# Altium schematic symbol library Capacitor - Ceramic - Sumsung.SchLib: 1421 symbols (part 4 of 8)
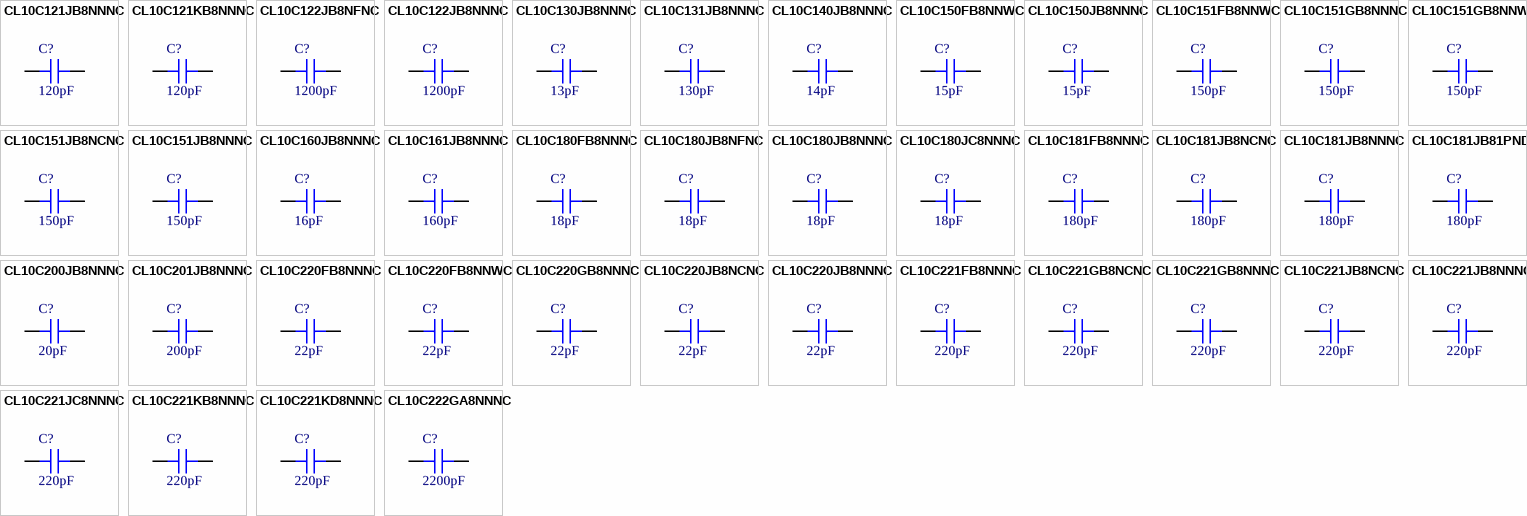
[diagram p38: symbols CL10C121JB8NNNC to CL10C222GA8NNNC]

## CL10C180JB8NNNC
designator C?, comment 18pF
CAP CER 18PF 50V NP0 0603; Part Number: CL10C180JB8NNNC; Manufacturer: Samsung Electro-Mechanics America, Inc.; TemperatureRange: -55C ~ 125C; TemperatureCoefficient: C0G, NP0; Tolerance: 5%; Value: 18pF; PartId: 5316; Supplier 1: Digi-Key; Supplier Part Number 1: 1276-1089-2-ND; ComponentLink1Description: Datasheet; ComponentLink1URL: http://www.samsungsem.com/kr/support/product-search/mlcc/CL10C180JB8NNNC.jsp; ComponentLink2Description: Digi-Key listing; ComponentLink2URL: http://digikey.com/product-detail/en/CL10C180JB8NNNC/1276-1089-2-ND/3886747; Voltage: 50V; Price: 0.0083; Type: -; Device Package: 0603 (1608 Metric)
footprint CAP 0603/1608
pins: 1, 2

## CL10C180JC8NNNC
designator C?, comment 18pF
CAP CER 18PF 100V NP0 0603; Part Number: CL10C180JC8NNNC; Manufacturer: Samsung Electro-Mechanics America, Inc.; TemperatureRange: -55C ~ 125C; TemperatureCoefficient: C0G, NP0; Tolerance: 5%; Value: 18pF; PartId: 5432; Supplier 1: Digi-Key; Supplier Part Number 1: 1276-2210-2-ND; ComponentLink1Description: Datasheet; ComponentLink1URL: http://www.samsungsem.com/kr/support/product-search/mlcc/CL10C180JC8NNNC.jsp; ComponentLink2Description: Digi-Key listing; ComponentLink2URL: http://digikey.com/product-detail/en/CL10C180JC8NNNC/1276-2210-2-ND/3887868; Voltage: 100V; Price: 0.0142; Type: -; Device Package: 0603 (1608 Metric)
footprint CAP 0603/1608
pins: 1, 2

## CL10C181FB8NNNC
designator C?, comment 180pF
CAP CER 180PF 50V NP0 0603; Part Number: CL10C181FB8NNNC; Manufacturer: Samsung Electro-Mechanics America, Inc.; TemperatureRange: -55C ~ 125C; TemperatureCoefficient: C0G, NP0; Tolerance: 1%; Value: 180pF; PartId: 5654; Supplier 1: Digi-Key; Supplier Part Number 1: 1276-2211-2-ND; ComponentLink1Description: Datasheet; ComponentLink1URL: http://media.digikey.com/pdf/Data%20Sheets/Samsung%20PDFs/CL10C181FB8NNNC_Spec.pdf; ComponentLink2Description: Digi-Key listing; ComponentLink2URL: http://digikey.com/product-detail/en/CL10C181FB8NNNC/1276-2211-2-ND/3887869; Voltage: 50V; Price: 0.0639; Type: -; Device Package: 0603 (1608 Metric)
footprint CAP 0603/1608
pins: 1, 2

## CL10C181JB8NCNC
designator C?, comment 180pF
CAP CER 180PF 50V NP0 0603; Part Number: CL10C181JB8NCNC; Manufacturer: Samsung Electro-Mechanics America, Inc.; TemperatureRange: -55C ~ 125C; TemperatureCoefficient: C0G, NP0; Tolerance: 5%; Value: 180pF; PartId: 13530; Supplier 1: Digi-Key; Supplier Part Number 1: 1276-2213-2-ND; ComponentLink1Description: Datasheet; ComponentLink1URL: //media.digikey.com/pdf/Data%20Sheets/Samsung%20PDFs/CL10C181JB8NCNC_Spec.pdf; ComponentLink2Description: Digi-Key Listing; ComponentLink2URL: https://www.digikey.com/product-detail/en/samsung-electro-mechanics-america-inc/CL10C181JB8NCNC/1276-2213-2-ND/3887871; Voltage: 50V; Price: 0.0053; Device Package: 0603 (1608 Metric)
footprint CAP 0603/1608
pins: 1, 2

## CL10C181JB8NNNC
designator C?, comment 180pF
CAP CER 180PF 50V NP0 0603; Part Number: CL10C181JB8NNNC; Manufacturer: Samsung Electro-Mechanics America, Inc.; TemperatureRange: -55C ~ 125C; TemperatureCoefficient: C0G, NP0; Tolerance: 5%; Value: 180pF; PartId: 5298; Supplier 1: Digi-Key; Supplier Part Number 1: 1276-1255-2-ND; ComponentLink1Description: Datasheet; ComponentLink1URL: http://www.samsungsem.com/kr/support/product-search/mlcc/CL10C181JB8NNNC.jsp; ComponentLink2Description: Digi-Key listing; ComponentLink2URL: http://digikey.com/product-detail/en/CL10C181JB8NNNC/1276-1255-2-ND/3886913; Voltage: 50V; Price: 0.0077; Type: -; Device Package: 0603 (1608 Metric)
footprint CAP 0603/1608
pins: 1, 2

## CL10C181JB81PND
designator C?, comment 180pF
CAP CER 180PF 50V C0G/NP0 0603; Part Number: CL10C181JB81PND; Manufacturer: Samsung Electro-Mechanics; TemperatureRange: -55C ~ 125C; TemperatureCoefficient: C0G, NP0; Tolerance: 5%; Value: 180pF; PartId: 30429; Supplier 1: Digi-Key; Supplier Part Number 1: 1276-6452-2-ND; ComponentLink1Description: Datasheet; ComponentLink1URL: http://www.samsungsem.com/kr/support/product-search/mlcc/CL10C181JB81PND.jsp; ComponentLink2Description: Digi-Key Listing; ComponentLink2URL: https://www.digikey.com/product-detail/en/samsung-electro-mechanics/CL10C181JB81PND/1276-6452-2-ND/3894347; Voltage: 50V; Price: 0; Device Package: 0603 (1608 Metric)
footprint CAP 0603/1608
pins: 1, 2

## CL10C200JB8NNNC
designator C?, comment 20pF
CAP CER 20PF 50V NP0 0603; Part Number: CL10C200JB8NNNC; Manufacturer: Samsung Electro-Mechanics America, Inc.; TemperatureRange: -55C ~ 125C; TemperatureCoefficient: C0G, NP0; Tolerance: 5%; Value: 20pF; PartId: 5318; Supplier 1: Digi-Key; Supplier Part Number 1: 1276-1187-2-ND; ComponentLink1Description: Datasheet; ComponentLink1URL: http://www.samsungsem.com/kr/support/product-search/mlcc/CL10C200JB8NNNC.jsp; ComponentLink2Description: Digi-Key listing; ComponentLink2URL: http://digikey.com/product-detail/en/CL10C200JB8NNNC/1276-1187-2-ND/3886845; Voltage: 50V; Price: 0.0085; Type: -; Device Package: 0603 (1608 Metric)
footprint CAP 0603/1608
pins: 1, 2

## CL10C201JB8NNNC
designator C?, comment 200pF
CAP CER 200PF 50V NP0 0603; Part Number: CL10C201JB8NNNC; Manufacturer: Samsung Electro-Mechanics America, Inc.; TemperatureRange: -55C ~ 125C; TemperatureCoefficient: C0G, NP0; Tolerance: 5%; Value: 200pF; PartId: 5467; Supplier 1: Digi-Key; Supplier Part Number 1: 1276-2222-2-ND; ComponentLink1Description: Datasheet; ComponentLink1URL: http://www.samsungsem.com/kr/support/product-search/mlcc/CL10C201JB8NNNC.jsp; ComponentLink2Description: Digi-Key listing; ComponentLink2URL: http://digikey.com/product-detail/en/CL10C201JB8NNNC/1276-2222-2-ND/3887880; Voltage: 50V; Price: 0.0163; Type: -; Device Package: 0603 (1608 Metric)
footprint CAP 0603/1608
pins: 1, 2

## CL10C220FB8NNNC
designator C?, comment 22pF
CAP CER 22PF 50V NP0 0603; Part Number: CL10C220FB8NNNC; Manufacturer: Samsung Electro-Mechanics America, Inc.; TemperatureRange: -55C ~ 125C; TemperatureCoefficient: C0G, NP0; Tolerance: 1%; Value: 22pF; PartId: 5611; Supplier 1: Digi-Key; Supplier Part Number 1: 1276-2223-2-ND; ComponentLink1Description: Datasheet; ComponentLink1URL: http://media.digikey.com/pdf/Data%20Sheets/Samsung%20PDFs/CL10C220FB8NNNC_Spec.pdf; ComponentLink2Description: Digi-Key listing; ComponentLink2URL: http://digikey.com/product-detail/en/CL10C220FB8NNNC/1276-2223-2-ND/3887881; Voltage: 50V; Price: 0.0342; Type: -; Device Package: 0603 (1608 Metric)
footprint CAP 0603/1608
pins: 1, 2

## CL10C220FB8NNWC
designator C?, comment 22pF
CAP CER 22PF 50V C0G/NP0 0603; Part Number: CL10C220FB8NNWC; Manufacturer: Samsung Electro-Mechanics; TemperatureRange: -55C ~ 125C; TemperatureCoefficient: C0G, NP0; Tolerance: 1%; Value: 22pF; PartId: 30713; Supplier 1: Digi-Key; Supplier Part Number 1: 1276-2224-2-ND; ComponentLink1Description: Datasheet; ComponentLink1URL: http://www.samsungsem.com/kr/support/product-search/mlcc/CL10C220FB8NNWC.jsp; ComponentLink2Description: Digi-Key Listing; ComponentLink2URL: https://www.digikey.com/product-detail/en/samsung-electro-mechanics/CL10C220FB8NNWC/1276-2224-2-ND/3887882; Voltage: 50V; Price: 0; Device Package: 0603 (1608 Metric)
footprint CAP 0603/1608
pins: 1, 2

## CL10C220GB8NNNC
designator C?, comment 22pF
CAP CER 22PF 50V NP0 0603; Part Number: CL10C220GB8NNNC; Manufacturer: Samsung Electro-Mechanics America, Inc.; TemperatureRange: -55C ~ 125C; TemperatureCoefficient: C0G, NP0; Tolerance: 2%; Value: 22pF; PartId: 5565; Supplier 1: Digi-Key; Supplier Part Number 1: 1276-2225-2-ND; ComponentLink1Description: Datasheet; ComponentLink1URL: http://www.samsungsem.com/kr/support/product-search/mlcc/CL10C220GB8NNNC.jsp; ComponentLink2Description: Digi-Key listing; ComponentLink2URL: http://digikey.com/product-detail/en/CL10C220GB8NNNC/1276-2225-2-ND/3887883; Voltage: 50V; Price: 0.0278; Type: -; Device Package: 0603 (1608 Metric)
footprint CAP 0603/1608
pins: 1, 2

## CL10C220JB8NCNC
designator C?, comment 22pF
CAP CER 22PF 50V NP0 0603; Part Number: CL10C220JB8NCNC; Manufacturer: Samsung Electro-Mechanics America, Inc.; TemperatureRange: -55C ~ 125C; TemperatureCoefficient: C0G, NP0; Tolerance: 5%; Value: 22pF; PartId: 5288; Supplier 1: Digi-Key; Supplier Part Number 1: 1276-2227-2-ND; ComponentLink1Description: Datasheet; ComponentLink1URL: http://media.digikey.com/pdf/Data%20Sheets/Samsung%20PDFs/CL10C220JB8NCNC_Spec.pdf; ComponentLink2Description: Digi-Key listing; ComponentLink2URL: http://digikey.com/product-detail/en/CL10C220JB8NCNC/1276-2227-2-ND/3887885; Voltage: 50V; Price: 0.0073; Type: -; Device Package: 0603 (1608 Metric)
footprint CAP 0603/1608
pins: 1, 2

## CL10C220JB8NNNC
designator C?, comment 22pF
CAP CER 22PF 50V NP0 0603; Part Number: CL10C220JB8NNNC; Manufacturer: Samsung Electro-Mechanics America, Inc.; TemperatureRange: -55C ~ 125C; TemperatureCoefficient: C0G, NP0; Tolerance: 5%; Value: 22pF; PartId: 13079; Supplier 1: Digi-Key; Supplier Part Number 1: 1276-1023-2-ND; ComponentLink1Description: Datasheet; ComponentLink1URL: http://www.samsungsem.com/kr/support/product-search/mlcc/CL10C220JB8NNNC.jsp; ComponentLink2Description: Digi-Key Listing; ComponentLink2URL: https://www.digikey.com/product-detail/en/samsung-electro-mechanics-america-inc/CL10C220JB8NNNC/1276-1023-2-ND/3886681; Voltage: 50V; Price: 0.0056; Device Package: 0603 (1608 Metric)
footprint CAP 0603/1608
pins: 1, 2

## CL10C221FB8NNNC
designator C?, comment 220pF
CAP CER 220PF 50V NP0 0603; Part Number: CL10C221FB8NNNC; Manufacturer: Samsung Electro-Mechanics America, Inc.; TemperatureRange: -55C ~ 125C; TemperatureCoefficient: C0G, NP0; Tolerance: 1%; Value: 220pF; PartId: 5656; Supplier 1: Digi-Key; Supplier Part Number 1: 1276-2230-2-ND; ComponentLink1Description: Datasheet; ComponentLink1URL: http://media.digikey.com/pdf/Data%20Sheets/Samsung%20PDFs/CL10C221FB8NNNC_Spec.pdf; ComponentLink2Description: Digi-Key listing; ComponentLink2URL: http://digikey.com/product-detail/en/CL10C221FB8NNNC/1276-2230-2-ND/3887888; Voltage: 50V; Price: 0.0665; Type: -; Device Package: 0603 (1608 Metric)
footprint CAP 0603/1608
pins: 1, 2

## CL10C221GB8NCNC
designator C?, comment 220pF
CAP CER 220PF 50V NP0 0603; Part Number: CL10C221GB8NCNC; Manufacturer: Samsung Electro-Mechanics America, Inc.; TemperatureRange: -55C ~ 125C; TemperatureCoefficient: C0G, NP0; Tolerance: 2%; Value: 220pF; PartId: 5462; Supplier 1: Digi-Key; Supplier Part Number 1: 1276-2231-2-ND; ComponentLink1Description: Datasheet; ComponentLink1URL: http://media.digikey.com/pdf/Data%20Sheets/Samsung%20PDFs/CL10C221GB8NCNC_Spec.pdf; ComponentLink2Description: Digi-Key listing; ComponentLink2URL: http://digikey.com/product-detail/en/CL10C221GB8NCNC/1276-2231-2-ND/3887889; Voltage: 50V; Price: 0.0163; Type: -; Device Package: 0603 (1608 Metric)
footprint CAP 0603/1608
pins: 1, 2

## CL10C221GB8NNNC
designator C?, comment 220pF
CAP CER 220PF 50V C0G/NP0 0603; Part Number: CL10C221GB8NNNC; Manufacturer: Samsung Electro-Mechanics; TemperatureRange: -55C ~ 125C; TemperatureCoefficient: C0G, NP0; Tolerance: 2%; Value: 220pF; PartId: 30757; Supplier 1: Digi-Key; Supplier Part Number 1: 1276-2232-2-ND; ComponentLink1Description: Datasheet; ComponentLink1URL: http://www.samsungsem.com/kr/support/product-search/mlcc/CL10C221GB8NNNC.jsp; ComponentLink2Description: Digi-Key Listing; ComponentLink2URL: https://www.digikey.com/product-detail/en/samsung-electro-mechanics/CL10C221GB8NNNC/1276-2232-2-ND/3887890; Voltage: 50V; Price: 0; Device Package: 0603 (1608 Metric)
footprint CAP 0603/1608
pins: 1, 2

## CL10C221JB8NCNC
designator C?, comment 220pF
CAP CER 220PF 50V NP0 0603; Part Number: CL10C221JB8NCNC; Manufacturer: Samsung Electro-Mechanics America, Inc.; TemperatureRange: -55C ~ 125C; TemperatureCoefficient: C0G, NP0; Tolerance: 5%; Value: 220pF; PartId: 5386; Supplier 1: Digi-Key; Supplier Part Number 1: 1276-2234-2-ND; ComponentLink1Description: Datasheet; ComponentLink1URL: http://media.digikey.com/pdf/Data%20Sheets/Samsung%20PDFs/CL10C221JB8NCNC_Spec.pdf; ComponentLink2Description: Digi-Key listing; ComponentLink2URL: http://digikey.com/product-detail/en/CL10C221JB8NCNC/1276-2234-2-ND/3887892; Voltage: 50V; Price: 0.0107; Type: -; Device Package: 0603 (1608 Metric)
footprint CAP 0603/1608
pins: 1, 2

## CL10C221JB8NNNC
designator C?, comment 220pF
CAP CER 220PF 50V NP0 0603; Part Number: CL10C221JB8NNNC; Manufacturer: Samsung Electro-Mechanics America, Inc.; TemperatureRange: -55C ~ 125C; TemperatureCoefficient: C0G, NP0; Tolerance: 5%; Value: 220pF; PartId: 13022; Supplier 1: Digi-Key; Supplier Part Number 1: 1276-1048-2-ND; ComponentLink1Description: Datasheet; ComponentLink1URL: http://www.samsungsem.com/kr/support/product-search/mlcc/CL10C221JB8NNNC.jsp; ComponentLink2Description: Digi-Key Listing; ComponentLink2URL: https://www.digikey.com/product-detail/en/samsung-electro-mechanics-america-inc/CL10C221JB8NNNC/1276-1048-2-ND/3886706; Voltage: 50V; Price: 0.0074; Device Package: 0603 (1608 Metric)
footprint CAP 0603/1608
pins: 1, 2

## CL10C221JC8NNNC
designator C?, comment 220pF
CAP CER 220PF 100V NP0 0603; Part Number: CL10C221JC8NNNC; Manufacturer: Samsung Electro-Mechanics America, Inc.; TemperatureRange: -55C ~ 125C; TemperatureCoefficient: C0G, NP0; Tolerance: 5%; Value: 220pF; PartId: 5419; Supplier 1: Digi-Key; Supplier Part Number 1: 1276-2237-2-ND; ComponentLink1Description: Datasheet; ComponentLink1URL: http://www.samsungsem.com/kr/support/product-search/mlcc/CL10C221JC8NNNC.jsp; ComponentLink2Description: Digi-Key listing; ComponentLink2URL: http://digikey.com/product-detail/en/CL10C221JC8NNNC/1276-2237-2-ND/3887895; Voltage: 100V; Price: 0.0132; Type: -; Device Package: 0603 (1608 Metric)
footprint CAP 0603/1608
pins: 1, 2

## CL10C221KB8NNNC
designator C?, comment 220pF
CAP CER 220PF 50V NP0 0603; Part Number: CL10C221KB8NNNC; Manufacturer: Samsung Electro-Mechanics America, Inc.; TemperatureRange: -55C ~ 125C; TemperatureCoefficient: C0G, NP0; Tolerance: 10%; Value: 220pF; PartId: 5390; Supplier 1: Digi-Key; Supplier Part Number 1: 1276-2238-2-ND; ComponentLink1Description: Datasheet; ComponentLink1URL: http://www.samsungsem.com/kr/support/product-search/mlcc/CL10C221KB8NNNC.jsp; ComponentLink2Description: Digi-Key listing; ComponentLink2URL: http://digikey.com/product-detail/en/CL10C221KB8NNNC/1276-2238-2-ND/3887896; Voltage: 50V; Price: 0.0107; Type: -; Device Package: 0603 (1608 Metric)
footprint CAP 0603/1608
pins: 1, 2

## CL10C221KD8NNNC
designator C?, comment 220pF
CAP CER 220PF 200V C0G/NP0 0603; Part Number: CL10C221KD8NNNC; Manufacturer: Samsung Electro-Mechanics; TemperatureRange: -55C ~ 125C; TemperatureCoefficient: C0G, NP0; Tolerance: 10%; Value: 220pF; PartId: 30432; Supplier 1: Digi-Key; Supplier Part Number 1: 1276-6579-2-ND; ComponentLink1Description: Datasheet; ComponentLink1URL: http://www.samsungsem.com/kr/support/product-search/mlcc/CL10C221KD8NNNC.jsp; ComponentLink2Description: Digi-Key Listing; ComponentLink2URL: https://www.digikey.com/product-detail/en/samsung-electro-mechanics/CL10C221KD8NNNC/1276-6579-2-ND/5961063; Voltage: 200V; Price: 0; Device Package: 0603 (1608 Metric)
footprint CAP 0603/1608
pins: 1, 2

## CL10C222GA8NNNC
designator C?, comment 2200pF
CAP CER 2200PF 25V NP0 0603; Part Number: CL10C222GA8NNNC; Manufacturer: Samsung Electro-Mechanics America, Inc.; TemperatureRange: -55C ~ 125C; TemperatureCoefficient: C0G, NP0; Tolerance: 2%; Value: 2200pF; PartId: 5643; Supplier 1: Digi-Key; Supplier Part Number 1: 1276-2239-2-ND; ComponentLink1Description: Datasheet; ComponentLink1URL: http://www.samsungsem.com/kr/support/product-search/mlcc/CL10C222GA8NNNC.jsp; ComponentLink2Description: Digi-Key listing; ComponentLink2URL: http://digikey.com/product-detail/en/CL10C222GA8NNNC/1276-2239-2-ND/3887897; Voltage: 25V; Price: 0.0462; Type: -; Device Package: 0603 (1608 Metric)
footprint CAP 0603/1608
pins: 1, 2

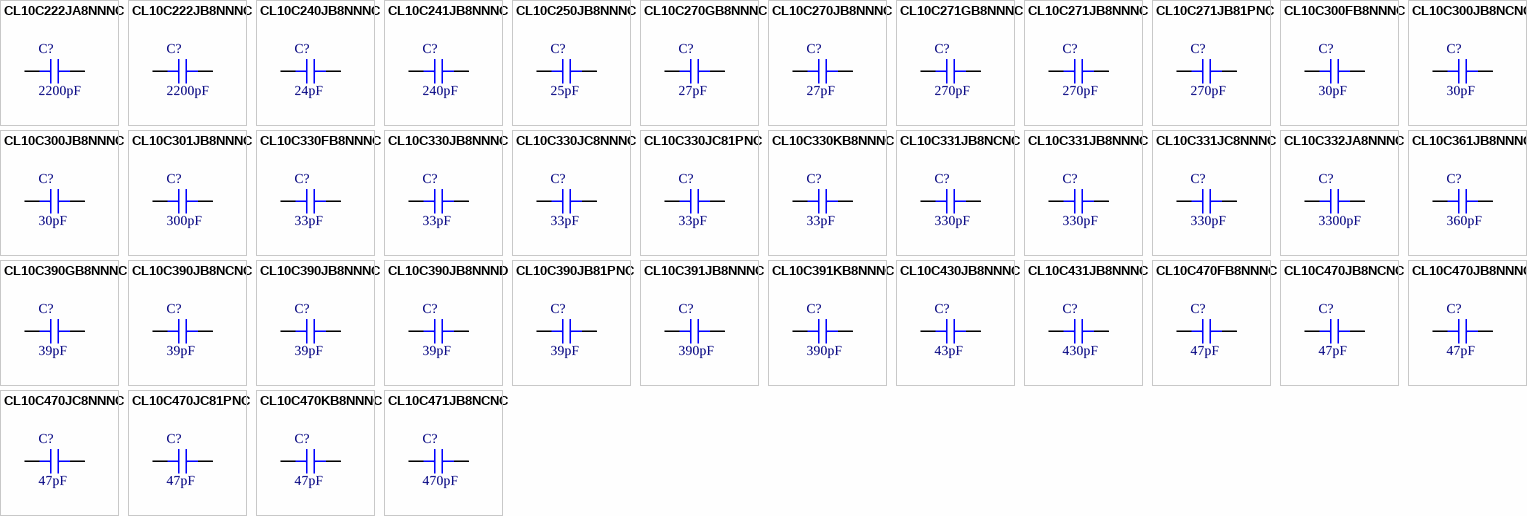
[diagram p15: symbols CL10C222JA8NNNC to CL10C471JB8NCNC]

## CL10C222JA8NNNC
designator C?, comment 2200pF
CAP CER 2200PF 25V NP0 0603; Part Number: CL10C222JA8NNNC; Manufacturer: Samsung Electro-Mechanics America, Inc.; TemperatureRange: -55C ~ 125C; TemperatureCoefficient: C0G, NP0; Tolerance: 5%; Value: 2200pF; PartId: 5563; Supplier 1: Digi-Key; Supplier Part Number 1: 1276-2240-2-ND; ComponentLink1Description: Datasheet; ComponentLink1URL: http://www.samsungsem.com/kr/support/product-search/mlcc/CL10C222JA8NNNC.jsp; ComponentLink2Description: Digi-Key listing; ComponentLink2URL: http://digikey.com/product-detail/en/CL10C222JA8NNNC/1276-2240-2-ND/3887898; Voltage: 25V; Price: 0.0267; Type: -; Device Package: 0603 (1608 Metric)
footprint CAP 0603/1608
pins: 1, 2

## CL10C222JB8NNNC
designator C?, comment 2200pF
CAP CER 2200PF 50V NP0 0603; Part Number: CL10C222JB8NNNC; Manufacturer: Samsung Electro-Mechanics America, Inc.; TemperatureRange: -55C ~ 125C; TemperatureCoefficient: C0G, NP0; Tolerance: 5%; Value: 2200pF; PartId: 13689; Supplier 1: Digi-Key; Supplier Part Number 1: 1276-1760-2-ND; ComponentLink1Description: Datasheet; ComponentLink1URL: http://www.samsungsem.com/kr/support/product-search/mlcc/CL10C222JB8NNNC.jsp; ComponentLink2Description: Digi-Key Listing; ComponentLink2URL: https://www.digikey.com/product-detail/en/samsung-electro-mechanics-america-inc/CL10C222JB8NNNC/1276-1760-2-ND/3887418; Voltage: 50V; Price: 0.018; Device Package: 0603 (1608 Metric)
footprint CAP 0603/1608
pins: 1, 2

## CL10C240JB8NNNC
designator C?, comment 24pF
CAP CER 24PF 50V NP0 0603; Part Number: CL10C240JB8NNNC; Manufacturer: Samsung Electro-Mechanics America, Inc.; TemperatureRange: -55C ~ 125C; TemperatureCoefficient: C0G, NP0; Tolerance: 5%; Value: 24pF; PartId: 5380; Supplier 1: Digi-Key; Supplier Part Number 1: 1276-1761-2-ND; ComponentLink1Description: Datasheet; ComponentLink1URL: http://www.samsungsem.com/kr/support/product-search/mlcc/CL10C240JB8NNNC.jsp; ComponentLink2Description: Digi-Key listing; ComponentLink2URL: http://digikey.com/product-detail/en/CL10C240JB8NNNC/1276-1761-2-ND/3887419; Voltage: 50V; Price: 0.0102; Type: -; Device Package: 0603 (1608 Metric)
footprint CAP 0603/1608
pins: 1, 2

## CL10C241JB8NNNC
designator C?, comment 240pF
CAP CER 240PF 50V NP0 0603; Part Number: CL10C241JB8NNNC; Manufacturer: Samsung Electro-Mechanics America, Inc.; TemperatureRange: -55C ~ 125C; TemperatureCoefficient: C0G, NP0; Tolerance: 5%; Value: 240pF; PartId: 5463; Supplier 1: Digi-Key; Supplier Part Number 1: 1276-2243-2-ND; ComponentLink1Description: Datasheet; ComponentLink1URL: http://www.samsungsem.com/kr/support/product-search/mlcc/CL10C241JB8NNNC.jsp; ComponentLink2Description: Digi-Key listing; ComponentLink2URL: http://digikey.com/product-detail/en/CL10C241JB8NNNC/1276-2243-2-ND/3887901; Voltage: 50V; Price: 0.0163; Type: -; Device Package: 0603 (1608 Metric)
footprint CAP 0603/1608
pins: 1, 2

## CL10C250JB8NNNC
designator C?, comment 25pF
CAP CER 25PF 50V NP0 0603; Part Number: CL10C250JB8NNNC; Manufacturer: Samsung Electro-Mechanics America, Inc.; TemperatureRange: -55C ~ 125C; TemperatureCoefficient: C0G, NP0; Tolerance: 5%; Value: 25pF; PartId: 13481; Supplier 1: Digi-Key; Supplier Part Number 1: 1276-2244-2-ND; ComponentLink1Description: Datasheet; ComponentLink1URL: http://www.samsungsem.com/kr/support/product-search/mlcc/CL10C250JB8NNNC.jsp; ComponentLink2Description: Digi-Key Listing; ComponentLink2URL: https://www.digikey.com/product-detail/en/samsung-electro-mechanics-america-inc/CL10C250JB8NNNC/1276-2244-2-ND/3887902; Voltage: 50V; Price: 0.0023; Device Package: 0603 (1608 Metric)
footprint CAP 0603/1608
pins: 1, 2

## CL10C270GB8NNNC
designator C?, comment 27pF
CAP CER 27PF 50V NP0 0603; Part Number: CL10C270GB8NNNC; Manufacturer: Samsung Electro-Mechanics America, Inc.; TemperatureRange: -55C ~ 125C; TemperatureCoefficient: C0G, NP0; Tolerance: 2%; Value: 27pF; PartId: 5569; Supplier 1: Digi-Key; Supplier Part Number 1: 1276-2246-2-ND; ComponentLink1Description: Datasheet; ComponentLink1URL: http://www.samsungsem.com/kr/support/product-search/mlcc/CL10C270GB8NNNC.jsp; ComponentLink2Description: Digi-Key listing; ComponentLink2URL: http://digikey.com/product-detail/en/CL10C270GB8NNNC/1276-2246-2-ND/3887904; Voltage: 50V; Price: 0.0278; Type: -; Device Package: 0603 (1608 Metric)
footprint CAP 0603/1608
pins: 1, 2

## CL10C270JB8NNNC
designator C?, comment 27pF
CAP CER 27PF 50V NP0 0603; Part Number: CL10C270JB8NNNC; Manufacturer: Samsung Electro-Mechanics America, Inc.; TemperatureRange: -55C ~ 125C; TemperatureCoefficient: C0G, NP0; Tolerance: 5%; Value: 27pF; PartId: 5302; Supplier 1: Digi-Key; Supplier Part Number 1: 1276-1086-2-ND; ComponentLink1Description: Datasheet; ComponentLink1URL: http://www.samsungsem.com/kr/support/product-search/mlcc/CL10C270JB8NNNC.jsp; ComponentLink2Description: Digi-Key listing; ComponentLink2URL: http://digikey.com/product-detail/en/CL10C270JB8NNNC/1276-1086-2-ND/3886744; Voltage: 50V; Price: 0.0077; Type: -; Device Package: 0603 (1608 Metric)
footprint CAP 0603/1608
pins: 1, 2

## CL10C271GB8NNNC
designator C?, comment 270pF
CAP CER 270PF 50V NP0 0603; Part Number: CL10C271GB8NNNC; Manufacturer: Samsung Electro-Mechanics America, Inc.; TemperatureRange: -55C ~ 125C; TemperatureCoefficient: C0G, NP0; Tolerance: 2%; Value: 270pF; PartId: 5629; Supplier 1: Digi-Key; Supplier Part Number 1: 1276-2252-2-ND; ComponentLink1Description: Datasheet; ComponentLink1URL: http://www.samsungsem.com/kr/support/product-search/mlcc/CL10C271GB8NNNC.jsp; ComponentLink2Description: Digi-Key listing; ComponentLink2URL: http://digikey.com/product-detail/en/CL10C271GB8NNNC/1276-2252-2-ND/3887910; Voltage: 50V; Price: 0.039; Type: -; Device Package: 0603 (1608 Metric)
footprint CAP 0603/1608
pins: 1, 2

## CL10C271JB8NNNC
designator C?, comment 270pF
CAP CER 270PF 50V NP0 0603; Part Number: CL10C271JB8NNNC; Manufacturer: Samsung Electro-Mechanics America, Inc.; TemperatureRange: -55C ~ 125C; TemperatureCoefficient: C0G, NP0; Tolerance: 5%; Value: 270pF; PartId: 13205; Supplier 1: Digi-Key; Supplier Part Number 1: 1276-1256-2-ND; ComponentLink1Description: Datasheet; ComponentLink1URL: http://www.samsungsem.com/kr/support/product-search/mlcc/CL10C271JB8NNNC.jsp; ComponentLink2Description: Digi-Key Listing; ComponentLink2URL: https://www.digikey.com/product-detail/en/samsung-electro-mechanics-america-inc/CL10C271JB8NNNC/1276-1256-2-ND/3886914; Voltage: 50V; Price: 0.0092; Device Package: 0603 (1608 Metric)
footprint CAP 0603/1608
pins: 1, 2

## CL10C271JB81PNC
designator C?, comment 270pF
CAP CER 270PF 50V C0G/NP0 0603; Part Number: CL10C271JB81PNC; Manufacturer: Samsung Electro-Mechanics; TemperatureRange: -55C ~ 125C; TemperatureCoefficient: C0G, NP0; Tolerance: 5%; Value: 270pF; PartId: 30703; Supplier 1: Digi-Key; Supplier Part Number 1: 1276-7006-2-ND; ComponentLink1Description: Datasheet; ComponentLink1URL: http://www.samsungsem.com/kr/support/product-search/mlcc/CL10C271JB81PNC.jsp; ComponentLink2Description: Digi-Key Listing; ComponentLink2URL: https://www.digikey.com/product-detail/en/samsung-electro-mechanics/CL10C271JB81PNC/1276-7006-2-ND/7320511; Voltage: 50V; Price: 0; Device Package: 0603 (1608 Metric)
footprint CAP 0603/1608
pins: 1, 2

## CL10C300FB8NNNC
designator C?, comment 30pF
CAP CER 30PF 50V NP0 0603; Part Number: CL10C300FB8NNNC; Manufacturer: Samsung Electro-Mechanics America, Inc.; TemperatureRange: -55C ~ 125C; TemperatureCoefficient: C0G, NP0; Tolerance: 1%; Value: 30pF; PartId: 5496; Supplier 1: Digi-Key; Supplier Part Number 1: 1276-2259-2-ND; ComponentLink1Description: Datasheet; ComponentLink1URL: http://media.digikey.com/pdf/Data%20Sheets/Samsung%20PDFs/CL10C300FB8NNNC_Spec.pdf; ComponentLink2Description: Digi-Key listing; ComponentLink2URL: http://digikey.com/product-detail/en/CL10C300FB8NNNC/1276-2259-2-ND/3887917; Voltage: 50V; Price: 0.0204; Type: -; Device Package: 0603 (1608 Metric)
footprint CAP 0603/1608
pins: 1, 2

## CL10C300JB8NCNC
designator C?, comment 30pF
CAP CER 30PF 50V C0G/NP0 0603; Part Number: CL10C300JB8NCNC; Manufacturer: Samsung Electro-Mechanics; TemperatureRange: -55C ~ 125C; TemperatureCoefficient: C0G, NP0; Tolerance: 5%; Value: 30pF; PartId: 30213; Supplier 1: Digi-Key; Supplier Part Number 1: 1276-2260-2-ND; ComponentLink1Description: Datasheet; ComponentLink1URL: http://www.samsungsem.com/kr/support/product-search/mlcc/CL10C300JB8NCNC.jsp; ComponentLink2Description: Digi-Key Listing; ComponentLink2URL: https://www.digikey.com/product-detail/en/samsung-electro-mechanics/CL10C300JB8NCNC/1276-2260-2-ND/3887918; Voltage: 50V; Price: 0; Device Package: 0603 (1608 Metric)
footprint CAP 0603/1608
pins: 1, 2

## CL10C300JB8NNNC
designator C?, comment 30pF
CAP CER 30PF 50V NP0 0603; Part Number: CL10C300JB8NNNC; Manufacturer: Samsung Electro-Mechanics America, Inc.; TemperatureRange: -55C ~ 125C; TemperatureCoefficient: C0G, NP0; Tolerance: 5%; Value: 30pF; PartId: 5310; Supplier 1: Digi-Key; Supplier Part Number 1: 1276-1021-2-ND; ComponentLink1Description: Datasheet; ComponentLink1URL: http://www.samsungsem.com/kr/support/product-search/mlcc/CL10C300JB8NNNC.jsp; ComponentLink2Description: Digi-Key listing; ComponentLink2URL: http://digikey.com/product-detail/en/CL10C300JB8NNNC/1276-1021-2-ND/3886679; Voltage: 50V; Price: 0.0081; Type: -; Device Package: 0603 (1608 Metric)
footprint CAP 0603/1608
pins: 1, 2

## CL10C301JB8NNNC
designator C?, comment 300pF
CAP CER 300PF 50V NP0 0603; Part Number: CL10C301JB8NNNC; Manufacturer: Samsung Electro-Mechanics America, Inc.; TemperatureRange: -55C ~ 125C; TemperatureCoefficient: C0G, NP0; Tolerance: 5%; Value: 300pF; PartId: 5464; Supplier 1: Digi-Key; Supplier Part Number 1: 1276-2261-2-ND; ComponentLink1Description: Datasheet; ComponentLink1URL: http://www.samsungsem.com/kr/support/product-search/mlcc/CL10C301JB8NNNC.jsp; ComponentLink2Description: Digi-Key listing; ComponentLink2URL: http://digikey.com/product-detail/en/CL10C301JB8NNNC/1276-2261-2-ND/3887919; Voltage: 50V; Price: 0.0163; Type: -; Device Package: 0603 (1608 Metric)
footprint CAP 0603/1608
pins: 1, 2

## CL10C330FB8NNNC
designator C?, comment 33pF
CAP CER 33PF 50V NP0 0603; Part Number: CL10C330FB8NNNC; Manufacturer: Samsung Electro-Mechanics America, Inc.; TemperatureRange: -55C ~ 125C; TemperatureCoefficient: C0G, NP0; Tolerance: 1%; Value: 33pF; PartId: 13679; Supplier 1: Digi-Key; Supplier Part Number 1: 1276-2262-2-ND; ComponentLink1Description: Datasheet; ComponentLink1URL: //media.digikey.com/pdf/Data%20Sheets/Samsung%20PDFs/CL10C330FB8NNNC_Spec.pdf; ComponentLink2Description: Digi-Key Listing; ComponentLink2URL: https://www.digikey.com/product-detail/en/samsung-electro-mechanics-america-inc/CL10C330FB8NNNC/1276-2262-2-ND/3887920; Voltage: 50V; Price: 0.0238; Device Package: 0603 (1608 Metric)
footprint CAP 0603/1608
pins: 1, 2

## CL10C330JB8NNNC
designator C?, comment 33pF
CAP CER 33PF 50V NP0 0603; Part Number: CL10C330JB8NNNC; Manufacturer: Samsung Electro-Mechanics America, Inc.; TemperatureRange: -55C ~ 125C; TemperatureCoefficient: C0G, NP0; Tolerance: 5%; Value: 33pF; PartId: 5291; Supplier 1: Digi-Key; Supplier Part Number 1: 1276-1070-2-ND; ComponentLink1Description: Datasheet; ComponentLink1URL: http://www.samsungsem.com/kr/support/product-search/mlcc/CL10C330JB8NNNC.jsp; ComponentLink2Description: Digi-Key listing; ComponentLink2URL: http://digikey.com/product-detail/en/CL10C330JB8NNNC/1276-1070-2-ND/3886728; Voltage: 50V; Price: 0.0075; Type: -; Device Package: 0603 (1608 Metric)
footprint CAP 0603/1608
pins: 1, 2

## CL10C330JC8NNNC
designator C?, comment 33pF
CAP CER 33PF 100V NP0 0603; Part Number: CL10C330JC8NNNC; Manufacturer: Samsung Electro-Mechanics America, Inc.; TemperatureRange: -55C ~ 125C; TemperatureCoefficient: C0G, NP0; Tolerance: 5%; Value: 33pF; PartId: 5295; Supplier 1: Digi-Key; Supplier Part Number 1: 1276-2267-2-ND; ComponentLink1Description: Datasheet; ComponentLink1URL: http://www.samsungsem.com/kr/support/product-search/mlcc/CL10C330JC8NNNC.jsp; ComponentLink2Description: Digi-Key listing; ComponentLink2URL: http://digikey.com/product-detail/en/CL10C330JC8NNNC/1276-2267-2-ND/3887925; Voltage: 100V; Price: 0.0076; Type: -; Device Package: 0603 (1608 Metric)
footprint CAP 0603/1608
pins: 1, 2

## CL10C330JC81PNC
designator C?, comment 33pF
CAP CER 33PF 100V C0G/NP0 0603; Part Number: CL10C330JC81PNC; Manufacturer: Samsung Electro-Mechanics; TemperatureRange: -55C ~ 125C; TemperatureCoefficient: C0G, NP0; Tolerance: 5%; Value: 33pF; PartId: 30538; Supplier 1: Digi-Key; Supplier Part Number 1: 1276-6857-2-ND; ComponentLink1Description: Datasheet; ComponentLink1URL: http://www.samsungsem.com/kr/support/product-search/mlcc/CL10C330JC81PNC.jsp; ComponentLink2Description: Digi-Key Listing; ComponentLink2URL: https://www.digikey.com/product-detail/en/samsung-electro-mechanics/CL10C330JC81PNC/1276-6857-2-ND/5961341; Voltage: 100V; Price: 0; Device Package: 0603 (1608 Metric)
footprint CAP 0603/1608
pins: 1, 2

## CL10C330KB8NNNC
designator C?, comment 33pF
CAP CER 33PF 50V NP0 0603; Part Number: CL10C330KB8NNNC; Manufacturer: Samsung Electro-Mechanics America, Inc.; TemperatureRange: -55C ~ 125C; TemperatureCoefficient: C0G, NP0; Tolerance: 10%; Value: 33pF; PartId: 5292; Supplier 1: Digi-Key; Supplier Part Number 1: 1276-2268-2-ND; ComponentLink1Description: Datasheet; ComponentLink1URL: http://www.samsungsem.com/kr/support/product-search/mlcc/CL10C330KB8NNNC.jsp; ComponentLink2Description: Digi-Key listing; ComponentLink2URL: http://digikey.com/product-detail/en/CL10C330KB8NNNC/1276-2268-2-ND/3887926; Voltage: 50V; Price: 0.0075; Type: -; Device Package: 0603 (1608 Metric)
footprint CAP 0603/1608
pins: 1, 2

## CL10C331JB8NCNC
designator C?, comment 330pF
CAP CER 330PF 50V NP0 0603; Part Number: CL10C331JB8NCNC; Manufacturer: Samsung Electro-Mechanics America, Inc.; TemperatureRange: -55C ~ 125C; TemperatureCoefficient: C0G, NP0; Tolerance: 5%; Value: 330pF; PartId: 5408; Supplier 1: Digi-Key; Supplier Part Number 1: 1276-2272-2-ND; ComponentLink1Description: Datasheet; ComponentLink1URL: http://media.digikey.com/pdf/Data%20Sheets/Samsung%20PDFs/CL10C331JB8NCNC_Spec.pdf; ComponentLink2Description: Digi-Key listing; ComponentLink2URL: http://digikey.com/product-detail/en/CL10C331JB8NCNC/1276-2272-2-ND/3887930; Voltage: 50V; Price: 0.0122; Type: -; Device Package: 0603 (1608 Metric)
footprint CAP 0603/1608
pins: 1, 2

## CL10C331JB8NNNC
designator C?, comment 330pF
CAP CER 330PF 50V NP0 0603; Part Number: CL10C331JB8NNNC; Manufacturer: Samsung Electro-Mechanics America, Inc.; TemperatureRange: -55C ~ 125C; TemperatureCoefficient: C0G, NP0; Tolerance: 5%; Value: 330pF; PartId: 13285; Supplier 1: Digi-Key; Supplier Part Number 1: 1276-1073-2-ND; ComponentLink1Description: Datasheet; ComponentLink1URL: http://www.samsungsem.com/kr/support/product-search/mlcc/CL10C331JB8NNNC.jsp; ComponentLink2Description: Digi-Key Listing; ComponentLink2URL: https://www.digikey.com/product-detail/en/samsung-electro-mechanics-america-inc/CL10C331JB8NNNC/1276-1073-2-ND/3886731; Voltage: 50V; Price: 0.0094; Device Package: 0603 (1608 Metric)
footprint CAP 0603/1608
pins: 1, 2

## CL10C331JC8NNNC
designator C?, comment 330pF